# Altium footprint library MS-Electronic.PcbLib: 213 footprints (part 1 of 14)
Each footprint in its own frame and in the unit in brackets; x right, y up, seen from the top. Pads: shape width x height; smd on the part's side, far side on the other; paste and mask are expansions set on the pad; w line width, h text height; cw(c..) or ccw(c..) is an arc to the next point about the centre after c.
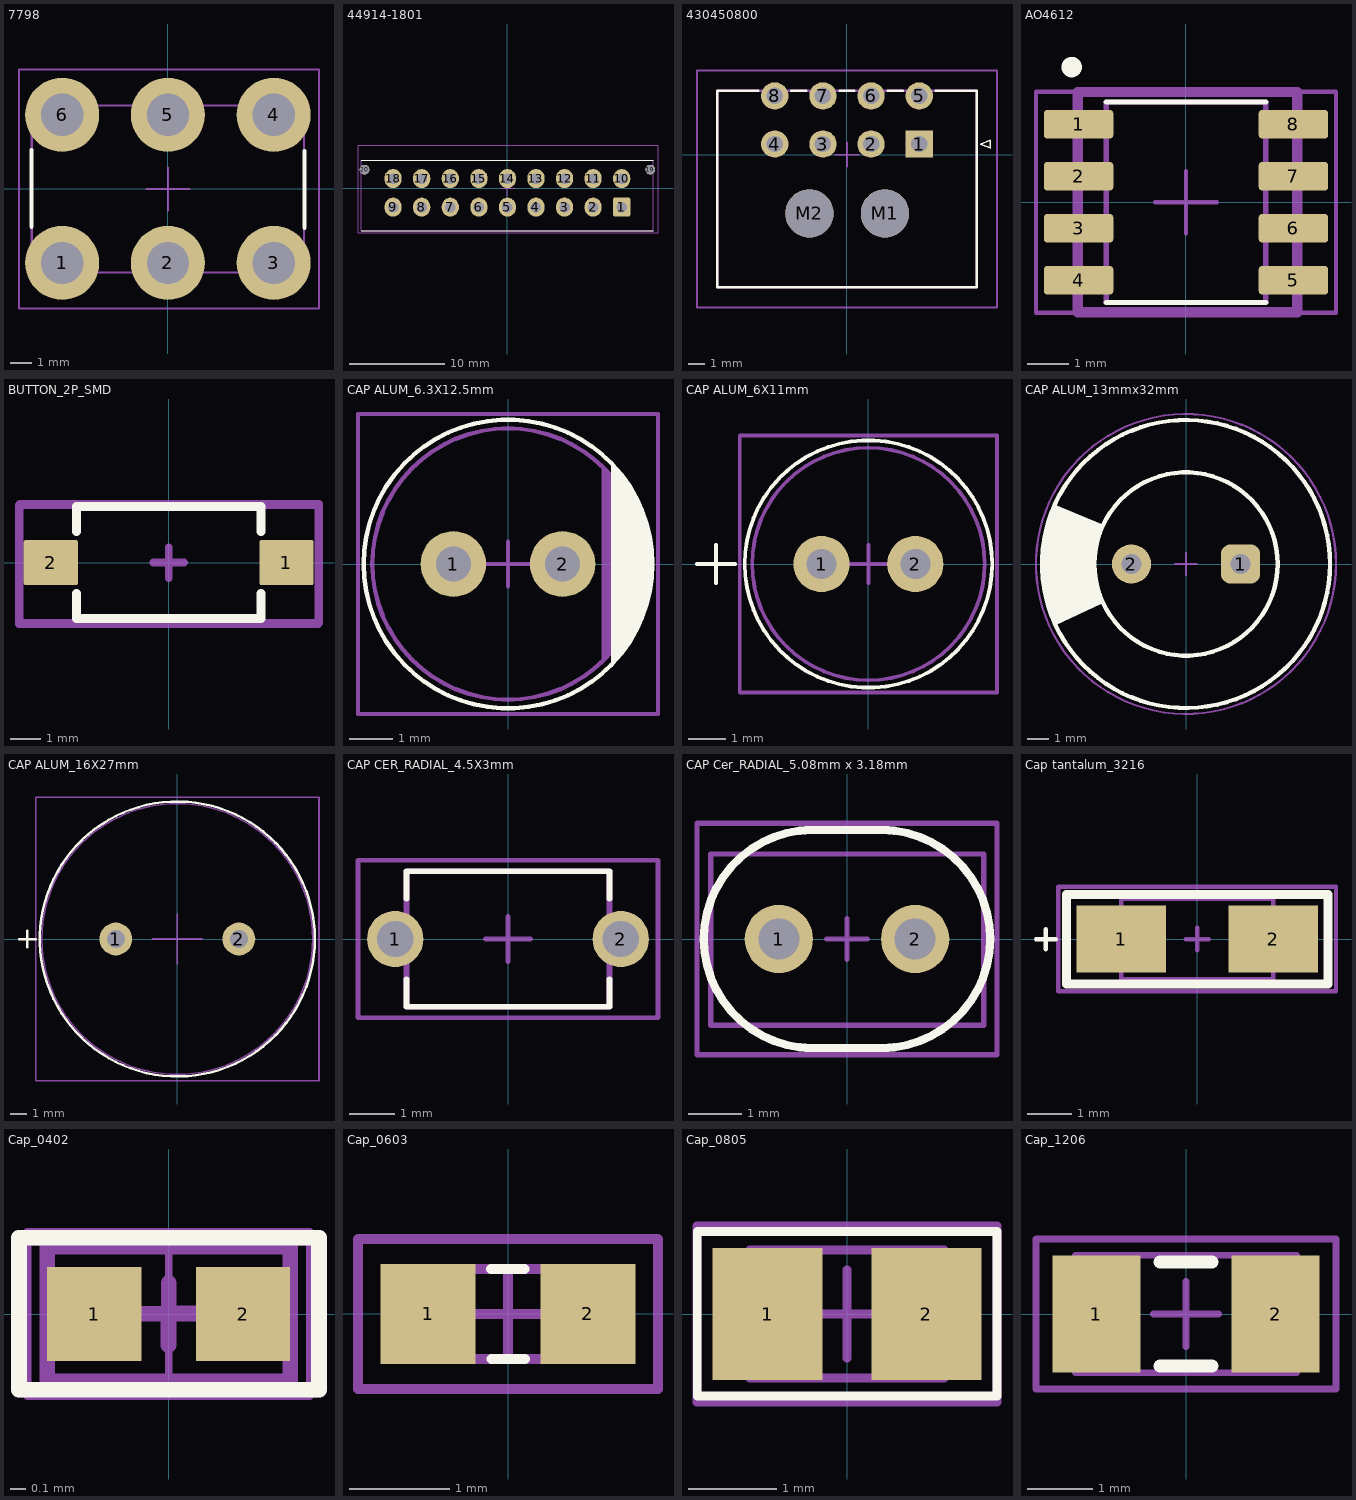
[diagram p0: the footprints below, top view; thin cyan lines are the x and y axes]

## 7798 [mm]
pads (6):
  round 3.5 hole 2 mask+0.07: 1(-5,-3.5) 2(0,-3.5) 3(5,-3.5) 4(5,3.5) 5(0,3.5) 6(-5,3.5)
Top Overlay:
  lines w0.2: -6.452,-1.794 -6.452,1.838 ; 6.452,-1.838 6.452,1.794
Top Assembly:
  lines w0.1: -6.44,-3.95 6.44,-3.95 6.44,3.95 -6.44,3.95 -6.44,-3.95
  text ".Designator" at -2.499,-0.167 h0.5
Top Component Center (Mech15):
  lines w0.1: -1.016,0 0,0 ; 0,-1.016 0,0 ; 0,1.016 0,0 ; 1.016,0 0,0 ; -7.04,-5.656 7.141,-5.656 7.141,5.644 -7.04,5.644 -7.04,-5.656
3D body "keystone-PN7798.STEP": height 7.68, standoff -4, extent -6.439,-4.552 6.439,4.5

## 44914-1801 [mm]
pads (20):
  rrect20% 1.8x2 hole 1.1 mask+0.07: 1(12,-1.97)
  oval 1.8x2 hole 1.1 mask+0.07: 2(9,-1.97) 3(6,-1.97) 4(3,-1.97) 5(0,-1.97) 6(-3,-1.97) 7(-6,-1.97) 8(-9,-1.97) 9(-12,-1.97) 10(12,1.03) 11(9,1.03) 12(6,1.03) 13(3,1.03) 14(0,1.03) 15(-3,1.03) 16(-6,1.03) 17(-9,1.03) 18(-12,1.03)
  round 1.02 hole 1.02 unplated mask+0.07: 19(15,1.97) 20(-15,1.97)
Top Overlay:
  lines w0.127: -15.325,-4.425 15.325,-4.425 ; -15.325,2.975 15.325,2.975
Top Assembly:
  lines w0.127: -15.325,-4.425 -15.325,2.975 15.325,2.975 15.325,-4.425 -15.325,-4.425
  text ".Designator" at -2.999,-0.2 h0.6
Top Component Center (Mech15):
  lines w0.1: -0.762,0 0,0 ; 0,-0.762 0,0 ; 0,0.762 0,0 ; 0.762,0 0,0 ; -15.686,-4.637 -15.686,4.507 15.81,4.507 15.81,-4.637 -15.686,-4.637
3D body "449141801.stp": height 9.9, standoff -3.18, extent -15.535,-4.45 15.615,4.35

## 430450800 [mm]
pads (10):
  rect 1.7x1.7 hole 1.02 mask+0.076: 1(4.5,0.66)
  round 1.7 hole 1.02 mask+0.076: 2(1.5,0.66) 3(-1.5,0.66) 4(-4.5,0.66) 5(4.5,3.66) 6(1.5,3.66) 7(-1.5,3.66) 8(-4.5,3.66)
  round 3 hole 3 unplated mask+0.076: M1(2.36,-3.66) M2(-2.34,-3.66)
Top Overlay:
  lines w0.1: 8.329,0.66 8.915,0.416 8.915,0.904 8.329,0.66
  lines w0.152: -5.532,3.98 -8.075,3.98 -8.075,-8.26 8.075,-8.26 8.075,3.98 5.532,3.98 ; -3.468,3.98 -2.532,3.98 ; -0.468,3.98 0.468,3.98 ; 2.532,3.98 3.468,3.98
Top Assembly:
  lines w0.127: -8.075,-8.26 -8.075,3.98 8.075,3.98 8.075,-8.26 -8.075,-8.26
  text ".Designator" at -2.999,-0.2 h0.6
Top Component Center (Mech15):
  lines w0.1: -0.762,0 0,0 ; 0,-0.762 0,0 ; 0,0.762 0,0 ; 0.762,0 0,0
  lines w0.127: -9.345,-9.53 9.345,-9.53 9.345,5.25 -9.345,5.25 -9.345,-9.53
3D body "430450800.stp": height 8.83, standoff -3.12, extent -8.075,-8.257 8.075,3.983

## AO4612 [mm]
pads (8):
  rrect25% 1.7x0.7 smd: 1(-2.625,1.905) 2(-2.625,0.635) 3(-2.625,-0.635) 4(-2.625,-1.905) 5(2.625,-1.905) 6(2.625,-0.635) 7(2.625,0.635) 8(2.625,1.905)
Top Overlay:
  circle w0.3: c-2.794,3.302 r0.1
  lines w0.127: -1.95,-2.45 1.95,-2.45 ; -1.95,2.45 1.95,2.45
Top Assembly:
  lines w0.254: -2.642,-2.692 -2.642,2.692 2.718,2.692 2.718,-2.692 -2.642,-2.692
  text ".Designator" at -4.998,-0.333 h1
Top 3D Body:
  lines w0.127: -1.95,-2.45 -1.95,2.45 1.95,2.45 1.95,-2.45 -1.95,-2.45
Top Component Center (Mech15):
  lines w0.1: -0.762,0 0,0 ; 0,-0.762 0,0 ; 0,0.762 0,0 ; 0.762,0 0,0 ; -3.665,-2.7 -3.665,2.7 3.665,2.7 3.665,-2.7 -3.665,-2.7

## BUTTON_2P_SMD [mm]
pads (2):
  rrect10% 1.8x1.5 smd mask+0.05: 1(3.9,0) 2(-3.9,0)
Top Overlay:
  lines w0.3: -3.05,-1.025 -3.05,-1.85 3.05,-1.85 ; -3.05,1.025 -3.05,1.85 3.05,1.85 ; -2.2,-1.85 3.05,-1.85 ; -2.2,1.85 3.05,1.85 ; 3.05,-1.025 3.05,-1.85 ; 3.05,1.025 3.05,1.85
Top Assembly:
  lines w0.254: -4.93,-1.999 -4.93,1.938 4.976,1.938 4.976,-1.999 -4.93,-1.999
  text "'.Designator'" at -6.143,-0.574 h2.54
Top Component Center (Mech15):
  lines w0.254: -0.508,0 0.508,0 ; 0,-0.508 0,0.508 ; -4.953,-2.032 -4.953,1.905 4.953,1.905 4.953,-2.032 -4.953,-2.032
3D body "User Library-KFC-2Pin SMD.step": height 4.2, standoff 0, extent -3.925,-1.825 4.075,1.675

## CAP ALUM_6.3X12.5mm [mm]
pads (2):
  round 1.5 hole 0.8 paste-2539.97: 1(-1.25,0) 2(1.25,0)
Top Overlay:
  circle w0.1: c0,0 r3.3
  region: 2.362,-2.304 2.513,-2.153 2.773,-1.814 2.987,-1.444 3.15,-1.05 3.261,-0.637 3.317,-0.214 3.317,0.214 3.261,0.637 3.15,1.05 2.987,1.444 2.773,1.814 2.513,2.153 2.362,2.304
  lines w0.1: 2.362,-2.311 2.362,-2.304
Top Assembly:
  circle w0.1: c0,0 r3.1
  region: 2.146,-2.304 2.297,-2.153 2.557,-1.814 2.771,-1.444 2.934,-1.05 3.045,-0.637 3.1,-0.214 3.1,0.214 3.045,0.637 2.934,1.05 2.771,1.444 2.557,1.814 2.297,2.153 2.146,2.304
  text ".Designator" at -4.998,-0.333 h1
Top Component Center (Mech15):
  lines w0.1: -0.508,0 0,0 ; 0,-0.508 0,0 ; 0,0.508 0,0 ; 0.508,0 0,0 ; -3.429,-3.429 -3.429,3.429 3.429,3.429 3.429,-3.429 -3.429,-3.429
3D body "Download_STP_860020x730xx+%28rev1%29.stp": height 10.89, standoff -20.11, extent -3.144,-3.138 3.14,3.15

## CAP ALUM_6X11mm [mm]
pads (2):
  round 1.5 hole 0.8 paste-2539.97: 1(-1.25,0) 2(1.25,0)
Top Overlay:
  circle w0.1: c0,0 r3.3
  lines w0.1: -4.572,0 -3.556,0 ; -4.064,-0.508 -4.064,0.508
Top Assembly:
  circle w0.1: c0,0 r3.1
  lines w0.1: -4.572,0 -3.556,0 ; -4.064,-0.508 -4.064,0.508
  text ".Designator" at -4.998,-0.333 h1
Top Component Center (Mech15):
  lines w0.1: -0.508,0 0,0 ; 0,-0.508 0,0 ; 0,0.508 0,0 ; 0.508,0 0,0 ; -3.429,-3.429 -3.429,3.429 3.429,3.429 3.429,-3.429 -3.429,-3.429
3D body "Download_STP_860020x730xx+%28rev1%29.stp": height 10.89, standoff -20.11, extent -3.144,-3.138 3.14,3.15

## CAP ALUM_13mmx32mm [mm]
pads (2):
  rrect50% 1.8x1.8 hole 0.9 mask+0.075: 1(2.5,0)
  round 1.8 hole 0.9 mask+0.075: 2(-2.5,0)
Top Overlay:
  circle w0.2: c0,0 r4.2
  circle w0.2: c0,0 r6.6
  region: -6,-2.8 -6.1,-2.4 -6.295,-1.824 -6.54,-1.1 -6.54,-0.349 -6.54,0.349 -6.49,0.996 -6.436,1.703 -6.007,2.72 -3.871,1.826 -3.957,1.608 -4.096,1.161 -4.189,0.702 -4.235,0.235 -4.236,-0.233 -4.189,-0.699 -4.096,-1.158 -3.958,-1.606 -3.872,-1.824
Top Assembly:
  circle w0.1: c0,0 r6.587
  text ".Designator" at -2.499,-0.167 h0.5
Top Component Center (Mech15):
  circle w0.1: c0,0 r6.873
  lines w0.1: -0.5,0 0.5,0 ; 0,-0.5 0,0.5
3D body "User Library-CAPAER_D125_L325_P050_W006X030.STEP": height 32.52, standoff -3, extent -6.26,-6.25 6.25,6.25

## CAP ALUM_16X27mm [mm]
pads (2):
  round 2 hole 1.1 paste-2539.97: 1(-3.75,0) 2(3.75,0)
Top Overlay:
  circle w0.152: c0,0 r8.382
  lines w0.152: -9.652,0 -8.636,0 ; -9.144,-0.508 -9.144,0.508
Top Assembly:
  circle w0.1: c0,0 r8.255
  lines w0.1: -9.652,0 -8.636,0 ; -9.144,-0.508 -9.144,0.508
  text ".Designator" at -4.998,-0.333 h1
Top Component Center (Mech15):
  lines w0.1: -1.524,0 0,0 ; 0,-1.524 0,0 ; 0,1.524 0,0 ; 1.524,0 0,0 ; -8.636,-8.636 -8.636,8.636 8.636,8.636 8.636,-8.636 -8.636,-8.636
3D body "CAP_YX_16X25_RUB.step": height 27.02, standoff -4.98, extent -8.255,-8.251 8.29,8.251

## CAP CER_RADIAL_4.5X3mm [mm]
pads (2):
  round 1.25 hole 0.8: 1(-2.5,0) 2(2.5,0)
Top Overlay:
  lines w0.127: -2.25,-0.895 -2.25,-1.5 2.25,-1.5 2.25,-0.895 ; -2.25,0.895 -2.25,1.5 2.25,1.5 2.25,0.895
Top Assembly:
  lines w0.127: -2.25,-1.5 2.25,-1.5 2.25,1.5 -2.25,1.5 -2.25,-1.5
  text ".Designator" at -3.999,-0.267 h0.8
Top Component Center (Mech15):
  lines w0.1: -0.508,0 0,0 ; 0,-0.508 0,0 ; 0,0.508 0,0 ; 0.508,0 0,0 ; -3.325,-1.75 3.325,-1.75 3.325,1.75 -3.325,1.75 -3.325,-1.75
3D body "step_temp.STEP": height 5.5, standoff -7, extent -2.75,-1.5 2.75,1.5

## CAP Cer_RADIAL_5.08mm x 3.18mm [mil]
pads (2):
  round 50 hole 30 paste-99999: 1(-50,0) 2(50,0)
Top Overlay:
  lines w6: -30,-80 30,-80 ; -30,80 30,80 ; -25,-80 cw(c-25,0) -25,80 ; 25,-80 ccw(c25,0) 105,0 ccw(c25,0) 25,80
Top Assembly:
  lines w3.94: -100.01,-63.19 100.24,-63.19 100.24,62.31 -100.01,62.31 -100.01,-63.19
  text ".Designator" at -118.07,-7.87 h23.62
Top Component Center (Mech15):
  lines w3.94: -15,0 0,0 ; 0,-15 0,0 ; 0,15 0,0 ; 15,0 0,0 ; -110,-85 110,-85 110,85 -110,85 -110,-85
3D body "C320C104K5R5TA.step": height 289.76, standoff -275.59, extent -100,-63 100,62.39

## Cap tantalum_3216 [mm]
pads (2):
  rect 2x1.5 smd: 1(-1.7,0) 2(1.7,0)
Top Overlay:
  lines w0.1: -3.6,0 -3.156,0 ; -3.378,-0.222 -3.378,0.222
  lines w0.2: -2.921,-1 2.921,-1 2.921,1 -2.921,1 -2.921,-1
Top Assembly:
  lines w0.1: -1.7,-0.899 1.703,-0.899 1.7,-0.899 1.7,0.899 -1.7,0.899 -1.7,-0.899
  text ".Designator" at -2.999,-0.2 h0.6
Top Component Center (Mech15):
  lines w0.1: -0.254,0 0,0 ; 0,-0.254 0,0 ; 0,0.254 0,0 ; 0.254,0 0,0 ; -3.1,-1.17 -3.1,1.174 3.099,1.174 3.099,-1.17 -3.1,-1.17
3D body "CAP_TANT_3216-18.step": height 1.69, standoff -0.01, extent -1.7,-0.9 1.7,0.9

## Cap_0402 [mm]
pads (2):
  rect 0.6x0.6 smd: 1(-0.475,0) 2(0.475,0)
Top Overlay:
  lines w0.1: -0.955,-0.483 -0.955,0.485 0.959,0.485 0.959,-0.483 -0.955,-0.483
Top Assembly:
  lines w0.1: -0.775,-0.43 0.775,-0.43 0.775,0.43 -0.775,0.43 -0.775,-0.43
  text ".Designator" at -2.499,-0.167 h0.5
Top Component Center (Mech15):
  lines w0.1: -0.2,0.001 0,0.001 ; -0.003,0.003 0.197,0.003 ; -0.001,-0.198 -0.001,0.002 ; 0,0 0,0.2 ; -0.955,-0.483 -0.955,0.485 0.959,0.485 0.959,-0.483 -0.955,-0.483
Mechanical 17:
  lines w0.05: -0.5,0 0.5,0 ; 0,-0.5 0,0.5 ; -0.9,-0.525 -0.9,0.525 0.9,0.525 0.9,-0.525 -0.9,-0.525
3D body "CAPC1005X06.step": height 0.6, standoff 0, extent -0.5,-0.25 0.5,0.25

## Cap_0603 [mm]
height 0.87
pads (2):
  rect 0.95x1 smd: 1(-0.8,0) 2(0.8,0)
Top Overlay:
  lines w0.1: -0.168,0.448 0.166,0.448 ; -0.166,-0.448 0.168,-0.448
Top Assembly:
  lines w0.1: -0.85,-0.45 -0.85,0.45 0.85,0.45 0.85,-0.45 -0.85,-0.45
  text ".Designator" at -1.999,-0.133 h0.4
Top Component Center (Mech15):
  lines w0.1: -0.45,0 0.45,0 ; 0,-0.45 0,0.45 ; -1.5,-0.75 -1.5,0.75 1.5,0.75 1.5,-0.75 -1.5,-0.75
3D body "Cap_C0603C220J5GACTU.step": height 0.87, standoff 0, extent -0.85,-0.45 0.85,0.45

## Cap_0805 [mm]
height 1.45
pads (2):
  rect 1.25x1.5 smd: 1(-0.9,0) 2(0.9,0)
Top Overlay:
  lines w0.1: -1.698,-0.93 1.699,-0.93 1.699,0.933 -1.698,0.933 -1.698,-0.93
Top Assembly:
  lines w0.1: -1.1,-0.725 -1.1,0.725 1.1,0.725 1.1,-0.725 -1.1,-0.725
  text ".Designator" at -2.499,-0.167 h0.5
Top Component Center (Mech15):
  lines w0.1: -0.5,0 0.5,0 ; 0,-0.5 0,0.5 ; -1.7,-1 -1.7,1 1.7,1 1.7,-1 -1.7,-1
3D body "Cap_0805.step": height 1.45, standoff 0, extent -1.1,-0.725 1.1,0.725

## Cap_1206 [mm]
height 1.8
pads (2):
  rect 1.35x1.8 smd: 1(-1.375,0) 2(1.375,0)
Top Overlay:
  lines w0.2: -0.4,-0.8 0.4,-0.8 ; -0.4,0.8 0.4,0.8
Top Assembly:
  lines w0.1: -1.7,-0.9 -1.7,0.9 1.7,0.9 1.7,-0.9 -1.7,-0.9
  text ".Designator" at -2.999,-0.2 h0.6
Top Component Center (Mech15):
  lines w0.1: -0.5,0 0.5,0 ; 0,-0.5 0,0.5 ; -2.3,-1.15 -2.3,1.15 2.3,1.15 2.3,-1.15 -2.3,-1.15
3D body "Cap_1206.step": height 1.8, standoff 0, extent -1.7,-0.9 1.7,0.9